# Altium footprint library ESKDPcbLib.PcbLib: 608 footprints (part 38 of 38)
Each footprint in its own frame and in the unit in brackets; x right, y up, seen from the top. Pads: shape width x height; smd on the part's side, far side on the other; paste and mask are expansions set on the pad; w line width, h text height; cw(c..) or ccw(c..) is an arc to the next point about the centre after c.
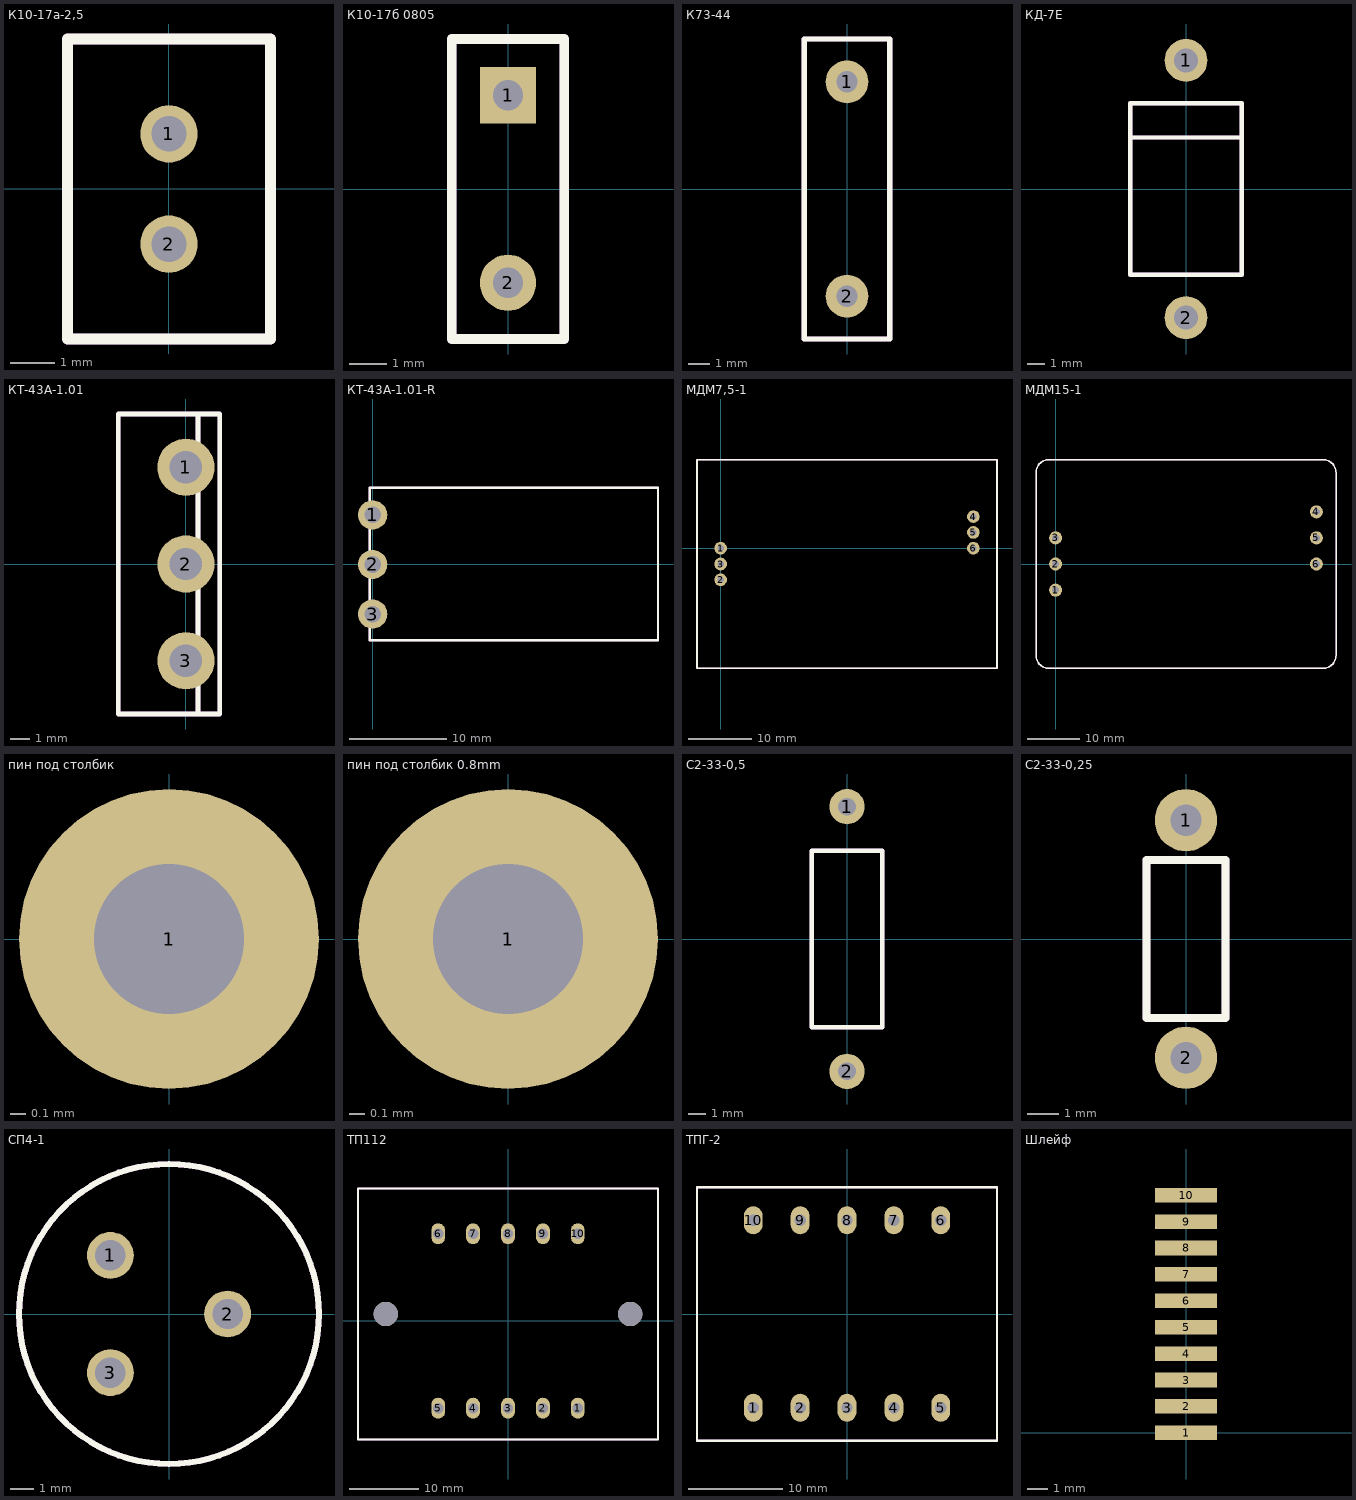
[diagram p37: the footprints below, top view; thin cyan lines are the x and y axes]

## К10-17а-2,5 [mm]
pads (2):
  round 1.3 hole 0.8: 1(0,1.25) 2(0,-1.25)
Top Overlay:
  lines w0.254: -2.3,-3.4 -2.3,3.4 2.3,3.4 2.3,-3.4 -2.3,-3.4
Mechanical 7:
  lines w0.254: -2.3,-3.4 -2.3,3.4 2.3,3.4 2.3,-3.4 -2.3,-3.4
Mechanical 10:
  text ".Comment" at 2.9,0.5 h1
  text ".Designator" at 2.9,1.5 h1
3D body "К10-17а-МП0-2,5.STEP": height 5.6, standoff -4, extent -2.3,-3.4 2.3,3.4

## К10-17б 0805 [mm]
pads (2):
  rect 1.5x1.5 hole 0.8: 1(0,2.5)
  round 1.5 hole 0.8: 2(0,-2.5)
Top Overlay:
  lines w0.254: -1.5,-4 1.5,-4 1.5,4 -1.5,4 -1.5,-4
Mechanical 7:
  lines w0.254: -1.5,-4 -1.5,4 1.5,4 1.5,-4 -1.5,-4
Mechanical 10:
  text ".Comment" at 3.85,-3.475 h1.5
  text ".Designator" at 2.625,-3.48 h1.5
3D body "K10-17-1B-H90-0_1uF.STEP": height 7, standoff -2.5, extent -1.502,-2.8 1.5,2.802

## К73-44 [mm]
pads (2):
  round 2 hole 1: 1(0,5) 2(0,-5)
Top Overlay:
  lines w0.254: -2,-7 2,-7 2,7 -2,7 -2,-7
Mechanical 7:
  lines w0.254: -2,-7 2,-7 2,7 -2,7 -2,-7
Mechanical 10:
  text ".Comment" at 3,5 h1.52
  text ".Designator" at 3,3 h1.52

## КД-7Е [mm]
pads (2):
  round 2.5 hole 1.4: 1(0,7.5) 2(0,-7.5)
Top Overlay:
  lines w0.254: -3.25,3 3.25,3 ; -3.25,-5 3.25,-5 3.25,5 -3.25,5 -3.25,-5
Mechanical 7:
  lines w0.254: -3.25,3 3.25,3 ; -3.25,-5 3.25,-5 3.25,5 -3.25,5 -3.25,-5
Mechanical 10:
  text ".Comment" at 3.65,1.5 h1
  text ".Designator" at 3.65,2.5 h1

## КТ-43А-1.01 [mm]
pads (3):
  round 3 hole 1.7: 1(0,5.08) 2(0,0) 3(0,-5.08)
Top Overlay:
  lines w0.254: 0.635,-7.874 0.635,7.874 ; -3.556,-7.874 -3.556,7.874 1.778,7.874 1.778,-7.874 -3.556,-7.874
Mechanical 7:
  lines w0.254: 0.635,-7.874 0.635,7.874 ; -3.556,-7.874 -3.556,7.874 1.778,7.874 1.778,-7.874 -3.556,-7.874
Mechanical 10:
  text ".Comment" at 2.38,2.77 h1
  text ".Designator" at 2.38,3.77 h1
3D body "KT-43A-1_01.STEP": height 25, standoff -13, extent -3.522,-7.8 1.778,7.8

## КТ-43А-1.01-R [mm]
pads (3):
  round 3 hole 1.7: 1(0,5.08) 2(0,0) 3(0,-5.08)
Top Overlay:
  lines w0.254: -0.3,-7.75 29.25,-7.75 29.25,7.85 -0.3,7.85 -0.3,-7.75
Mechanical 7:
  lines w0.254: -0.3,-7.75 29.25,-7.75 29.25,7.85 -0.3,7.85 -0.3,-7.75
Mechanical 10:
  text ".Designator" at 0.305,9.57 h1
  text ".Comment" at 0.305,8.57 h1
3D body "KT-43A-1_01_R.STEP": height 5.5, standoff -7.1, extent -0.297,-7.747 29.253,7.853

## МДМ7,5-1 [mm]
pads (6):
  round 2 hole 1: 1(0,0) 2(0,-5) 3(0,-2.5) 4(40,5) 5(40,2.5) 6(40,0)
Top Overlay:
  lines w0.254: -3.75,-19 -3.75,14 43.75,14 43.75,-19 -3.75,-19
Mechanical 7:
  lines w0.254: -3.75,-19 -3.75,14 43.75,14 43.75,-19 -3.75,-19
Mechanical 10:
  text ".Designator" at -3.35,15.75 h1
  text ".Comment" at -3.35,14.75 h1
3D body "МДМ7,5-1.STEP": height 10, standoff -7.5, extent -3.75,-19 43.75,14

## МДМ15-1 [mm]
pads (6):
  round 2.5 hole 1.3: 1(0,-5) 2(0,0) 3(0,5) 4(50,10) 5(50,5) 6(50,0)
Top Overlay:
  lines w0.254: -3.75,-17.5 ccw(c-1.25,-17.5) -1.25,-20 51.25,-20 ccw(c51.25,-17.5) 53.75,-17.5 53.75,17.5 ccw(c51.25,17.5) 51.25,20 -1.25,20 ccw(c-1.25,17.5) -3.75,17.5 -3.75,-17.5
Mechanical 7:
  lines w0.254: -3.75,-17.5 ccw(c-1.25,-17.5) -1.25,-20 51.25,-20 ccw(c51.25,-17.5) 53.75,-17.5 53.75,17.5 ccw(c51.25,17.5) 51.25,20 -1.25,20 ccw(c-1.25,17.5) -3.75,17.5 -3.75,-17.5
Mechanical 10:
  text ".Comment" at 5.4,21 h1
  text ".Designator" at 5.4,22 h1
3D body "МДМ15-1В.STEP": height 10, standoff -7.5, extent -3.75,-20 53.75,20

## пин под столбик [mm]
pads (1):
  round 2 hole 1: 1(0,0)

## пин под столбик 0.8mm [mm]
pads (1):
  round 2 hole 1: 1(0,0)

## С2-33-0,5 [mm]
pads (2):
  round 2 hole 1: 1(0,7.5) 2(0,-7.5)
Top Overlay:
  lines w0.254: -2,-5 -2,5 2,5 2,-5 -2,-5
Mechanical 7:
  lines w0.254: -2,-5 -2,0 -2,5 2,5 2,-5 1,-5 -2,-5
Mechanical 10:
  text ".Designator" at 2.5,3 h1
  text ".Comment" at 2.5,2 h1
3D body "C2-33-0,5.STEP": height 4.2, standoff -2.5, extent -2.1,-7.9 2.1,7.9

## С2-33-0,25 [mm]
pads (2):
  round 2 hole 1: 1(0,3.81) 2(0,-3.81)
Top Overlay:
  lines w0.254: -1.27,-2.54 -1.27,2.54 1.27,2.54 1.27,-2.54 -1.27,-2.54
Mechanical 7:
  lines w0.254: -1.27,-2.54 -1.27,-0.35 -1.27,1.365 -1.27,2.54 1.27,2.54 1.27,-2.54 -1.27,-2.54
Mechanical 10:
  text ".Designator" at 2.5,3 h1
  text ".Comment" at 2.5,2 h1
3D body "с2-33-0,25.STEP": height 2.7, standoff -2.58, extent -1.2,-4.085 1.2,4.085

## СП4-1 [mm]
pads (3):
  round 2 hole 1.3: 1(-2.5,2.5) 2(2.5,0) 3(-2.5,-2.5)
Top Overlay:
  circle w0.254: c0,0 r6.4
Mechanical 7:
  circle w0.254: c0,0 r6.4
Mechanical 10:
  text ".Designator" at 2,9 h1
  text ".Comment" at 2,8 h1

## ТП112 [mm] "Varystor"
pads (12):
  oval 2x3 hole 1.5: 1(10,-12.5) 2(5,-12.5) 3(0,-12.5) 4(-5,-12.5) 5(-10,-12.5) 6(-10,12.5) 7(-5,12.5) 8(0,12.5) 9(5,12.5) 10(10,12.5)
  round 3.5 hole 3.5 unplated: ""(-17.5,1) ""(17.5,1)
Top Overlay:
  lines w0.254: -21.5,-17 -21.5,19 21.5,19 21.5,-17 -21.5,-17
Mechanical 7:
  lines w0.254: -21.5,-17 -21.5,19 21.5,19 21.5,-17 -21.5,-17
Mechanical 10:
  text ".Comment" at -11,20 h1
  text ".Designator" at -11,21 h1
3D body "ТП112.STEP": height 40, standoff -4, extent -21.5,-17.1 21.5,18.9

## ТПГ-2 [mm] "Varystor"
pads (10):
  oval 2x3 hole 1.2: 1(-10,-10) 2(-5,-10) 3(0,-10) 4(5,-10) 5(10,-10) 6(10,10) 7(5,10) 8(0,10) 9(-5,10) 10(-10,10)
Top Overlay:
  lines w0.254: -16,-13.5 16,-13.5 16,13.5 -16,13.5 -16,-13.5
Mechanical 7:
  lines w0.254: -16,-13.5 16,-13.5 16,13.5 -16,13.5 -16,-13.5
Mechanical 10:
  text ".Designator" at -13.5,15.5 h1
  text ".Comment" at -13.5,14.5 h1
3D body "ТПГ-1.STEP": height 23, standoff -4, extent -16.025,-13.521 15.975,13.479

## Шлейф [mm]
pads (10):
  rect 3x0.7 smd: 1(0,0) 2(0,1.27) 3(0,2.54) 4(0,3.81) 5(0,5.08) 6(0,6.35) 7(0,7.62) 8(0,8.89) 9(0,10.16) 10(0,11.43)